# Altium schematic symbol library FPGA_Xilinx_Virtex7.SchLib: 34 symbols (part 28 of 34)
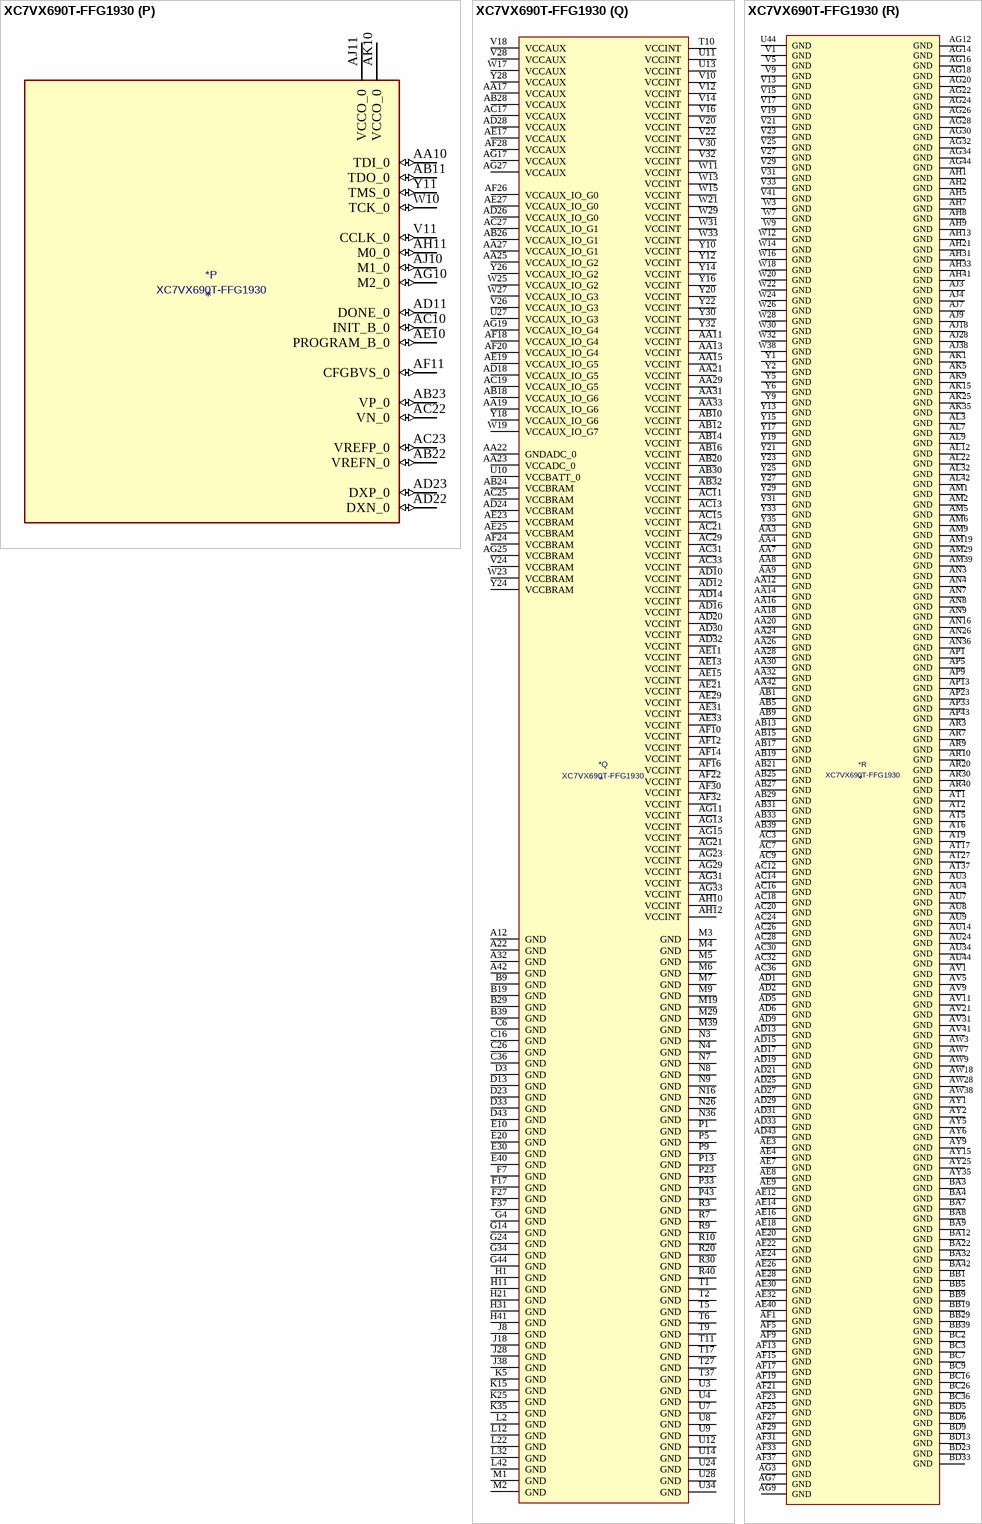
[diagram p199: symbol XC7VX690T-FFG1930]

## XC7VX690T-FFG1930
designator *  value XC7VX690T-FFG1930
ki_keywords: FPGA; ki_description: Virtex 7 XT 690 XC7VX690T-FFG1930
part A pins: AH29 IO_L4P_T0_10 (io), AH30 IO_L4N_T0_10 (io), AJ29 IO_0_VRN_10 (io), AJ30 IO_L1P_T0_10 (io), AJ31 IO_L1N_T0_10 (io), AK29 IO_L2P_T0_10 (io), AK30 VCCO_10 (power), AK31 IO_L5P_T0_10 (io), AL29 IO_L2N_T0_10 (io), AL30 IO_L3P_T0_DQS_10 (io), AL31 IO_L5N_T0_10 (io), AM30 IO_L3N_T0_DQS_10 (io), AM31 IO_25_VRP_10 (io), AN29 IO_L6P_T0_10 (io), AN30 IO_L6N_T0_VREF_10 (io), AN31 VCCO_10 (power), AP29 IO_L8P_T1_10 (io), AP30 IO_L8N_T1_10 (io), AP31 IO_L7P_T1_10 (io), AR29 IO_L10P_T1_10 (io), AR31 IO_L7N_T1_10 (io), AT29 IO_L10N_T1_10 (io), AT30 IO_L9P_T1_DQS_10 (io), AT31 IO_L9N_T1_DQS_10 (io), AU29 VCCO_10 (power), AU30 IO_L11P_T1_SRCC_10 (io), AU31 IO_L11N_T1_SRCC_10 (io), AV29 IO_L12P_T1_MRCC_10 (io), AV30 IO_L12N_T1_MRCC_10 (io), AV32 IO_L13P_T2_MRCC_10 (io), AW29 IO_L15P_T2_DQS_10 (io), AW30 IO_L14P_T2_SRCC_10 (io), AW31 IO_L14N_T2_SRCC_10 (io), AW32 IO_L13N_T2_MRCC_10 (io), AW33 VCCO_10 (power), AW34 IO_0_VRN_11 (io), AW41 IO_L7P_T1_11 (io), AW42 IO_L6P_T0_11 (io), AW43 VCCO_11 (power), AW44 IO_L1P_T0_11 (io), AY29 IO_L15N_T2_DQS_10 (io), AY30 VCCO_10 (power), AY31 IO_L16P_T2_10 (io), AY32 IO_L16N_T2_10 (io), AY33 IO_L24P_T3_11 (io), AY34 IO_25_VRP_11 (io), AY36 IO_L18P_T2_11 (io), AY37 IO_L16P_T2_11 (io), AY38 IO_L16N_T2_11 (io), AY39 IO_L11P_T1_SRCC_11 (io), AY40 VCCO_11 (power), AY41 IO_L7N_T1_11 (io), AY42 IO_L6N_T0_VREF_11 (io), AY43 IO_L3P_T0_DQS_11 (io), AY44 IO_L1N_T0_11 (io), BA28 IO_L17P_T2_10 (io), BA29 IO_L17N_T2_10 (io), BA30 IO_L18P_T2_10 (io), BA31 IO_L18N_T2_10 (io), BA33 IO_L24N_T3_11 (io), BA34 IO_L19P_T3_11 (io), BA35 IO_L19N_T3_VREF_11 (io), BA36 IO_L18N_T2_11 (io), BA37 VCCO_11 (power), BA38 IO_L13P_T2_MRCC_11 (io), BA39 IO_L11N_T1_SRCC_11 (io), BA40 IO_L9P_T1_DQS_11 (io), BA41 IO_L9N_T1_DQS_11 (io), BA43 IO_L5P_T0_11 (io), BA44 IO_L3N_T0_DQS_11 (io), BB28 IO_L24P_T3_10 (io), BB30 IO_L22P_T3_10 (io), BB31 IO_L19P_T3_10 (io), BB32 IO_L19N_T3_VREF_10 (io), BB33 IO_L22P_T3_11 (io), BB34 VCCO_11 (power), BB35 IO_L23P_T3_11 (io), BB36 IO_L15P_T2_DQS_11 (io), BB37 IO_L15N_T2_DQS_11 (io), BB38 IO_L13N_T2_MRCC_11 (io), BB40 IO_L8P_T1_11 (io), BB41 IO_L8N_T1_11 (io), BB42 IO_L4P_T0_11 (io), BB43 IO_L5N_T0_11 (io), BB44 VCCO_11 (power), BC28 IO_L24N_T3_10 (io), BC29 IO_L23P_T3_10 (io), BC30 IO_L22N_T3_10 (io), BC31 VCCO_10 (power), BC32 IO_L20P_T3_10 (io), BC33 IO_L22N_T3_11 (io), BC34 IO_L20P_T3_11 (io), BC35 IO_L23N_T3_11 (io), BC37 IO_L17P_T2_11 (io), BC38 IO_L14P_T2_SRCC_11 (io), BC39 IO_L12P_T1_MRCC_11 (io), BC40 IO_L10P_T1_11 (io), BC41 VCCO_11 (power), BC42 IO_L2P_T0_11 (io), BC43 IO_L4N_T0_11 (io), BD29 IO_L23N_T3_10 (io), BD30 IO_L21P_T3_DQS_10 (io), BD31 IO_L21N_T3_DQS_10 (io), BD32 IO_L20N_T3_10 (io), BD34 IO_L20N_T3_11 (io), BD35 IO_L21P_T3_DQS_11 (io), BD36 IO_L21N_T3_DQS_11 (io), BD37 IO_L17N_T2_11 (io), BD38 VCCO_11 (power), BD39 IO_L14N_T2_SRCC_11 (io), BD40 IO_L12N_T1_MRCC_11 (io), BD41 IO_L10N_T1_11 (io), BD42 IO_L2N_T0_11 (io)
part B pins: AH26 VCCO_12 (power), AH27 IO_L2P_T0_12 (io), AH28 IO_0_VRN_12 (io), AJ25 IO_L3P_T0_DQS_12 (io), AJ26 IO_L3N_T0_DQS_12 (io), AJ27 IO_L2N_T0_12 (io), AK26 IO_L4P_T0_12 (io), AK27 IO_L4N_T0_12 (io), AK28 IO_L1P_T0_12 (io), AL25 IO_L5P_T0_12 (io), AL26 IO_L6P_T0_12 (io), AL27 VCCO_12 (power), AL28 IO_L1N_T0_12 (io), AM25 IO_L5N_T0_12 (io), AM26 IO_L6N_T0_VREF_12 (io), AM27 IO_25_VRP_12 (io), AM28 IO_L7P_T1_12 (io), AN25 IO_L8P_T1_12 (io), AN27 IO_L9P_T1_DQS_12 (io), AN28 IO_L7N_T1_12 (io), AP25 IO_L8N_T1_12 (io), AP26 IO_L10P_T1_12 (io), AP27 IO_L9N_T1_DQS_12 (io), AP28 VCCO_12 (power), AP32 IO_L24P_T3_13 (io), AP34 IO_L21P_T3_DQS_13 (io), AP35 IO_0_VRN_13 (io), AP36 IO_L15P_T2_DQS_13 (io), AP38 VCCO_13 (power), AR25 VCCO_12 (power), AR26 IO_L10N_T1_12 (io), AR27 IO_L11P_T1_SRCC_12 (io), AR28 IO_L11N_T1_SRCC_12 (io), AR32 IO_L24N_T3_13 (io), AR33 IO_L23P_T3_13 (io), AR34 IO_L21N_T3_DQS_13 (io), AR35 VCCO_13 (power), AR36 IO_L17P_T2_13 (io), AR37 IO_L15N_T2_DQS_13 (io), AR38 IO_L12P_T1_MRCC_13 (io), AR39 IO_L7P_T1_13 (io), AR41 IO_L6P_T0_13 (io), AR42 IO_L5P_T0_13 (io), AR43 IO_L5N_T0_13 (io), AR44 IO_L1P_T0_13 (io), AT25 IO_L12P_T1_MRCC_12 (io), AT26 IO_L12N_T1_MRCC_12 (io), AT28 IO_L13P_T2_MRCC_12 (io), AT32 VCCO_13 (power), AT33 IO_L23N_T3_13 (io), AT34 IO_L19P_T3_13 (io), AT35 IO_L19N_T3_VREF_13 (io), AT36 IO_L17N_T2_13 (io), AT38 IO_L11P_T1_SRCC_13 (io), AT39 IO_L12N_T1_MRCC_13 (io), AT40 IO_L7N_T1_13 (io), AT41 IO_L6N_T0_VREF_13 (io), AT42 VCCO_13 (power), AT43 IO_L3P_T0_DQS_13 (io), AT44 IO_L1N_T0_13 (io), AU25 IO_L15P_T2_DQS_12 (io), AU26 IO_L14P_T2_SRCC_12 (io), AU27 IO_L14N_T2_SRCC_12 (io), AU28 IO_L13N_T2_MRCC_12 (io), AU32 IO_L20P_T3_13 (io), AU33 IO_L20N_T3_13 (io), AU35 IO_25_VRP_13 (io), AU36 IO_L13P_T2_MRCC_13 (io), AU37 IO_L13N_T2_MRCC_13 (io), AU38 IO_L11N_T1_SRCC_13 (io), AU39 VCCO_13 (power), AU40 IO_L9P_T1_DQS_13 (io), AU41 IO_L9N_T1_DQS_13 (io), AU42 IO_L4P_T0_13 (io), AU43 IO_L3N_T0_DQS_13 (io), AV25 IO_L15N_T2_DQS_12 (io), AV26 VCCO_12 (power), AV27 IO_L18P_T2_12 (io), AV28 IO_L18N_T2_12 (io), AV33 IO_L22P_T3_13 (io), AV34 IO_L22N_T3_13 (io), AV35 IO_L16P_T2_13 (io), AV36 VCCO_13 (power), AV37 IO_L14P_T2_SRCC_13 (io), AV38 IO_L14N_T2_SRCC_13 (io), AV39 IO_L10P_T1_13 (io), AV40 IO_L8P_T1_13 (io), AV42 IO_L4N_T0_13 (io), AV43 IO_L2P_T0_13 (io), AV44 IO_L2N_T0_13 (io), AW25 IO_L17P_T2_12 (io), AW26 IO_L16P_T2_12 (io), AW27 IO_L16N_T2_12 (io), AW35 IO_L16N_T2_13 (io), AW36 IO_L18P_T2_13 (io), AW37 IO_L18N_T2_13 (io), AW39 IO_L10N_T1_13 (io), AW40 IO_L8N_T1_13 (io), AY26 IO_L17N_T2_12 (io), AY27 IO_L19P_T3_12 (io), AY28 IO_L19N_T3_VREF_12 (io), BA25 IO_L21P_T3_DQS_12 (io), BA26 IO_L21N_T3_DQS_12 (io), BA27 VCCO_12 (power), BB25 IO_L20P_T3_12 (io), BB26 IO_L20N_T3_12 (io), BB27 IO_L22P_T3_12 (io), BC25 IO_L23P_T3_12 (io), BC27 IO_L22N_T3_12 (io), BD25 IO_L23N_T3_12 (io), BD26 IO_L24P_T3_12 (io), BD27 IO_L24N_T3_12 (io), BD28 VCCO_12 (power)
part C pins: AH22 IO_L2P_T0_D02_14 (io), AH23 IO_L2N_T0_D03_14 (io), AH24 IO_L1P_T0_D00_MOSI_14 (io), AH25 IO_L1N_T0_D01_DIN_14 (io), AH32 IO_L21P_T3_DQS_15 (io), AJ21 IO_0_VRN_14 (io), AJ22 IO_L6P_T0_FCS_B_14 (io), AJ23 VCCO_14 (power), AJ24 IO_L5P_T0_D06_14 (io), AJ32 IO_L21N_T3_DQS_A18_15 (io), AJ33 VCCO_15 (power), AJ34 IO_L19P_T3_A22_15 (io), AJ35 IO_0_VRN_15 (io), AJ36 IO_L13P_T2_MRCC_15 (io), AK21 IO_L4P_T0_D04_14 (io), AK22 IO_L6N_T0_D08_VREF_14 (io), AK23 IO_L3P_T0_DQS_PUDC_B_14 (io), AK24 IO_L5N_T0_D07_14 (io), AK32 IO_L20P_T3_A20_15 (io), AK33 IO_L20N_T3_A19_15 (io), AK34 IO_L19N_T3_A21_VREF_15 (io), AK36 IO_L16P_T2_A28_15 (io), AK37 IO_L13N_T2_MRCC_15 (io), AK38 IO_L11P_T1_SRCC_15 (io), AK39 IO_L9P_T1_DQS_AD3P_15 (io), AK40 VCCO_15 (power), AK41 IO_L6P_T0_15 (io), AL21 IO_L4N_T0_D05_14 (io), AL23 IO_L3N_T0_DQS_EMCCLK_14 (io), AL24 IO_25_VRP_14 (io), AL33 IO_L23P_T3_FOE_B_15 (io), AL34 IO_L23N_T3_FWE_B_15 (io), AL35 IO_L18P_T2_A24_15 (io), AL36 IO_L16N_T2_A27_15 (io), AL37 VCCO_15 (power), AL38 IO_L11N_T1_SRCC_15 (io), AL39 IO_L9N_T1_DQS_AD3N_15 (io), AL40 IO_L7P_T1_AD2P_15 (io), AL41 IO_L6N_T0_VREF_15 (io), AL43 IO_L1P_T0_AD0P_15 (io), AL44 IO_L1N_T0_AD0N_15 (io), AM21 IO_L8P_T1_D11_14 (io), AM22 IO_L8N_T1_D12_14 (io), AM23 IO_L7P_T1_D09_14 (io), AM24 VCCO_14 (power), AM32 IO_L22P_T3_A17_15 (io), AM33 IO_L22N_T3_A16_15 (io), AM34 VCCO_15 (power), AM35 IO_L17P_T2_A26_15 (io), AM36 IO_L18N_T2_A23_15 (io), AM37 IO_L14P_T2_SRCC_15 (io), AM38 IO_L14N_T2_SRCC_15 (io), AM40 IO_L7N_T1_AD2N_15 (io), AM41 IO_L2P_T0_AD8P_15 (io), AM42 IO_L2N_T0_AD8N_15 (io), AM43 IO_L5P_T0_AD9P_15 (io), AM44 VCCO_15 (power), AN21 VCCO_14 (power), AN22 IO_L10P_T1_D14_14 (io), AN23 IO_L7N_T1_D10_14 (io), AN24 IO_L9P_T1_DQS_14 (io), AN32 IO_25_VRP_15 (io), AN33 IO_L24P_T3_RS1_15 (io), AN34 IO_L24N_T3_RS0_15 (io), AN35 IO_L17N_T2_A25_15 (io), AN37 IO_L15P_T2_DQS_15 (io), AN38 IO_L12P_T1_MRCC_15 (io), AN39 IO_L12N_T1_MRCC_15 (io), AN40 IO_L8P_T1_AD10P_15 (io), AN41 VCCO_15 (power), AN42 IO_L4P_T0_15 (io), AN43 IO_L5N_T0_AD9N_15 (io), AN44 IO_L3P_T0_DQS_AD1P_15 (io), AP21 IO_L12P_T1_MRCC_14 (io), AP22 IO_L10N_T1_D15_14 (io), AP24 IO_L9N_T1_DQS_D13_14 (io), AP37 IO_L15N_T2_DQS_ADV_B_15 (io), AP39 IO_L10P_T1_AD11P_15 (io), AP40 IO_L10N_T1_AD11N_15 (io), AP41 IO_L8N_T1_AD10N_15 (io), AP42 IO_L4N_T0_15 (io), AP44 IO_L3N_T0_DQS_AD1N_15 (io), AR21 IO_L13P_T2_MRCC_14 (io), AR22 IO_L12N_T1_MRCC_14 (io), AR23 IO_L11P_T1_SRCC_14 (io), AR24 IO_L11N_T1_SRCC_14 (io), AT21 IO_L13N_T2_MRCC_14 (io), AT22 VCCO_14 (power), AT23 IO_L14P_T2_SRCC_14 (io), AT24 IO_L14N_T2_SRCC_14 (io), AU21 IO_L15P_T2_DQS_RDWR_B_14 (io), AU22 IO_L15N_T2_DQS_DOUT_CSO_B_14 (io), AU23 IO_L16P_T2_CSI_B_14 (io), AV22 IO_L17P_T2_A14_D30_14 (io), AV23 IO_L16N_T2_A15_D31_14 (io), AV24 IO_L18P_T2_A12_D28_14 (io), AW22 IO_L17N_T2_A13_D29_14 (io), AW23 VCCO_14 (power), AW24 IO_L18N_T2_A11_D27_14 (io), AY22 IO_L19P_T3_A10_D26_14 (io), AY23 IO_L19N_T3_A09_D25_VREF_14 (io), AY24 IO_L20P_T3_A08_D24_14 (io), BA23 IO_L22P_T3_A05_D21_14 (io), BA24 IO_L20N_T3_A07_D23_14 (io), BB22 IO_L23P_T3_A03_D19_14 (io), BB23 IO_L22N_T3_A04_D20_14 (io), BB24 VCCO_14 (power), BC22 IO_L21P_T3_DQS_14 (io), BC23 IO_L23N_T3_A02_D18_14 (io), BC24 IO_L24P_T3_A01_D17_14 (io), BD22 IO_L21N_T3_DQS_A06_D22_14 (io), BD24 IO_L24N_T3_A00_D16_14 (io)
part D pins: AA34 IO_L22P_T3_17 (io), AA35 IO_L21N_T3_DQS_17 (io), AA36 IO_L19P_T3_17 (io), AA37 VCCO_17 (power), AA38 IO_L15N_T2_DQS_17 (io), AA39 IO_L14P_T2_SRCC_17 (io), AA40 IO_L14N_T2_SRCC_17 (io), AA41 IO_L9N_T1_DQS_17 (io), AA43 IO_L1P_T0_17 (io), AA44 IO_L1N_T0_17 (io), AB34 VCCO_17 (power), AB35 IO_L21P_T3_DQS_17 (io), AB36 IO_L23P_T3_17 (io), AB37 IO_L23N_T3_17 (io), AB38 IO_L15P_T2_DQS_17 (io), AB40 IO_L12N_T1_MRCC_17 (io), AB41 IO_L9P_T1_DQS_17 (io), AB42 IO_L8N_T1_17 (io), AB43 IO_L5N_T0_17 (io), AB44 VCCO_17 (power), AC34 IO_L24P_T3_17 (io), AC35 IO_L24N_T3_17 (io), AC37 IO_25_VRP_17 (io), AC38 IO_L17P_T2_17 (io), AC39 IO_L17N_T2_17 (io), AC40 IO_L12P_T1_MRCC_17 (io), AC41 VCCO_17 (power), AC42 IO_L8P_T1_17 (io), AC43 IO_L5P_T0_17 (io), AC44 IO_L3N_T0_DQS_17 (io), AD34 IO_L20P_T3_16 (io), AD35 IO_L20N_T3_16 (io), AD36 IO_L19P_T3_16 (io), AD37 IO_0_VRN_16 (io), AD38 VCCO_16 (power), AD39 IO_L7P_T1_16 (io), AD40 IO_L7N_T1_16 (io), AD41 IO_L10P_T1_17 (io), AD42 IO_L10N_T1_17 (io), AD44 IO_L3P_T0_DQS_17 (io), AE34 IO_L21P_T3_DQS_16 (io), AE35 VCCO_16 (power), AE36 IO_L22P_T3_16 (io), AE37 IO_L19N_T3_VREF_16 (io), AE38 IO_L16P_T2_16 (io), AE39 IO_L16N_T2_16 (io), AE41 IO_L9P_T1_DQS_16 (io), AE42 IO_L9N_T1_DQS_16 (io), AE43 IO_L5P_T0_16 (io), AE44 IO_L3P_T0_DQS_16 (io), AF34 IO_L21N_T3_DQS_16 (io), AF35 IO_L23P_T3_16 (io), AF36 IO_L22N_T3_16 (io), AF38 IO_L18P_T2_16 (io), AF39 IO_L13P_T2_MRCC_16 (io), AF40 IO_L13N_T2_MRCC_16 (io), AF41 IO_L8P_T1_16 (io), AF42 VCCO_16 (power), AF43 IO_L5N_T0_16 (io), AF44 IO_L3N_T0_DQS_16 (io), AG35 IO_L24P_T3_16 (io), AG36 IO_L23N_T3_16 (io), AG37 IO_L15P_T2_DQS_16 (io), AG38 IO_L18N_T2_16 (io), AG39 VCCO_16 (power), AG40 IO_L11P_T1_SRCC_16 (io), AG41 IO_L8N_T1_16 (io), AG42 IO_L10P_T1_16 (io), AG43 IO_L2P_T0_16 (io), AH34 IO_25_VRP_16 (io), AH35 IO_L24N_T3_16 (io), AH36 VCCO_16 (power), AH37 IO_L17P_T2_16 (io), AH38 IO_L15N_T2_DQS_16 (io), AH39 IO_L14P_T2_SRCC_16 (io), AH40 IO_L11N_T1_SRCC_16 (io), AH42 IO_L10N_T1_16 (io), AH43 IO_L2N_T0_16 (io), AH44 IO_L1P_T0_16 (io), AJ37 IO_L17N_T2_16 (io), AJ39 IO_L14N_T2_SRCC_16 (io), AJ40 IO_L12P_T1_MRCC_16 (io), AJ41 IO_L12N_T1_MRCC_16 (io), AJ42 IO_L6P_T0_16 (io), AJ43 VCCO_16 (power), AJ44 IO_L1N_T0_16 (io), AK42 IO_L6N_T0_VREF_16 (io), AK43 IO_L4P_T0_16 (io), AK44 IO_L4N_T0_16 (io), V42 IO_L7N_T1_17 (io), V43 IO_L2P_T0_17 (io), V44 IO_L2N_T0_17 (io), W34 IO_L20P_T3_17 (io), W35 IO_L20N_T3_17 (io), W36 IO_0_VRN_17 (io), W37 IO_L16N_T2_17 (io), W39 IO_L18N_T2_17 (io), W40 IO_L13N_T2_MRCC_17 (io), W41 IO_L11N_T1_SRCC_17 (io), W42 IO_L7P_T1_17 (io), W43 VCCO_17 (power), W44 IO_L4N_T0_17 (io), Y34 IO_L22N_T3_17 (io), Y36 IO_L19N_T3_VREF_17 (io), Y37 IO_L16P_T2_17 (io), Y38 IO_L18P_T2_17 (io), Y39 IO_L13P_T2_MRCC_17 (io), Y40 VCCO_17 (power), Y41 IO_L11P_T1_SRCC_17 (io), Y42 IO_L6P_T0_17 (io), Y43 IO_L6N_T0_VREF_17 (io), Y44 IO_L4P_T0_17 (io)
part E pins: K33 IO_L4N_T0_19 (io), K34 IO_L8N_T1_19 (io), K36 IO_L12N_T1_MRCC_19 (io), K37 IO_L13P_T2_MRCC_19 (io), K38 IO_L13N_T2_MRCC_19 (io), K39 IO_L16N_T2_19 (io), K40 VCCO_19 (power), K41 IO_L19N_T3_VREF_19 (io), K42 IO_L21P_T3_DQS_19 (io), K43 IO_L21N_T3_DQS_19 (io), K44 IO_L24N_T3_19 (io), L30 IO_0_VRN_19 (io), L31 IO_L2N_T0_19 (io), L33 IO_L4P_T0_19 (io), L34 IO_L8P_T1_19 (io), L35 IO_L10N_T1_19 (io), L36 IO_L12P_T1_MRCC_19 (io), L37 VCCO_19 (power), L38 IO_L14N_T2_SRCC_19 (io), L39 IO_L16P_T2_19 (io), L40 IO_L18N_T2_19 (io), L41 IO_L19P_T3_19 (io), L43 IO_L23N_T3_19 (io), L44 IO_L24P_T3_19 (io), M30 IO_L2P_T0_19 (io), M31 IO_L1P_T0_19 (io), M32 IO_L1N_T0_19 (io), M33 IO_L6N_T0_VREF_19 (io), M34 VCCO_19 (power), M35 IO_L10P_T1_19 (io), M36 IO_L9N_T1_DQS_19 (io), M37 IO_L11N_T1_SRCC_19 (io), M38 IO_L14P_T2_SRCC_19 (io), M40 IO_L18P_T2_19 (io), M41 IO_L17N_T2_19 (io), M42 IO_L20N_T3_19 (io), M43 IO_L23P_T3_19 (io), M44 VCCO_19 (power), N30 IO_L3N_T0_DQS_19 (io), N31 VCCO_19 (power), N32 IO_L6P_T0_19 (io), N33 IO_25_VRP_19 (io), N34 IO_L7N_T1_19 (io), N35 IO_L9P_T1_DQS_19 (io), N37 IO_L11P_T1_SRCC_19 (io), N38 IO_L15P_T2_DQS_19 (io), N39 IO_L15N_T2_DQS_19 (io), N40 IO_L17P_T2_19 (io), N41 VCCO_19 (power), N42 IO_L20P_T3_19 (io), N43 IO_L22P_T3_19 (io), N44 IO_L22N_T3_19 (io), P30 IO_L3P_T0_DQS_19 (io), P31 IO_L5P_T0_19 (io), P32 IO_L5N_T0_19 (io), P34 IO_L7P_T1_19 (io), P35 IO_0_VRN_18 (io), P36 IO_L8N_T1_18 (io), P37 IO_L12N_T1_MRCC_18 (io), P38 VCCO_18 (power), P39 IO_L15P_T2_DQS_18 (io), P40 IO_L15N_T2_DQS_18 (io), P41 IO_L21P_T3_DQS_18 (io), P42 IO_L21N_T3_DQS_18 (io), P44 IO_L24N_T3_18 (io), R31 IO_L2P_T0_18 (io), R32 IO_L2N_T0_18 (io), R33 IO_L4P_T0_18 (io), R34 IO_L4N_T0_18 (io), R35 VCCO_18 (power), R36 IO_L8P_T1_18 (io), R37 IO_L12P_T1_MRCC_18 (io), R38 IO_L14P_T2_SRCC_18 (io), R39 IO_L14N_T2_SRCC_18 (io), R41 IO_L19N_T3_VREF_18 (io), R42 IO_L23P_T3_18 (io), R43 IO_L23N_T3_18 (io), R44 IO_L24P_T3_18 (io), T30 IO_L1P_T0_18 (io), T31 IO_L1N_T0_18 (io), T32 VCCO_18 (power), T33 IO_L6P_T0_18 (io), T34 IO_L6N_T0_VREF_18 (io), T35 IO_L10P_T1_18 (io), T36 IO_L10N_T1_18 (io), T38 IO_L13N_T2_MRCC_18 (io), T39 IO_L17P_T2_18 (io), T40 IO_L17N_T2_18 (io), T41 IO_L19P_T3_18 (io), T42 VCCO_18 (power), T43 IO_L22P_T3_18 (io), T44 IO_L22N_T3_18 (io), U30 IO_L3P_T0_DQS_18 (io), U31 IO_L3N_T0_DQS_18 (io), U32 IO_L5P_T0_18 (io), U33 IO_L5N_T0_18 (io), U35 IO_L9N_T1_DQS_18 (io), U36 IO_L7P_T1_18 (io), U37 IO_L7N_T1_18 (io), U38 IO_L13P_T2_MRCC_18 (io), U39 VCCO_18 (power), U40 IO_L18P_T2_18 (io), U41 IO_L18N_T2_18 (io), U42 IO_L20P_T3_18 (io), U43 IO_L20N_T3_18 (io), V34 IO_25_VRP_18 (io), V35 IO_L9P_T1_DQS_18 (io), V36 VCCO_18 (power), V37 IO_L11P_T1_SRCC_18 (io), V38 IO_L11N_T1_SRCC_18 (io), V39 IO_L16P_T2_18 (io), V40 IO_L16N_T2_18 (io)
part F pins: A37 VCCO_21 (power), B34 VCCO_21 (power), C31 VCCO_21 (power), C41 VCCO_21 (power), D38 VCCO_21 (power), E35 VCCO_20 (power), F32 VCCO_20 (power), F42 VCCO_21 (power), G39 VCCO_20 (power), H36 VCCO_20 (power), J33 VCCO_20 (power), J43 VCCO_20 (power)
part G pins: AH14 IO_0_VRN_31 (io), AH15 IO_L4P_T0_31 (io), AH16 VCCO_31 (power), AH17 IO_25_VRP_30 (io), AH18 IO_0_VRN_30 (io), AH19 IO_L3P_T0_DQS_30 (io), AH20 IO_L5P_T0_30 (io), AJ14 IO_L1P_T0_31 (io), AJ15 IO_L4N_T0_31 (io), AJ16 IO_L2P_T0_31 (io), AJ17 IO_L1P_T0_30 (io), AJ19 IO_L3N_T0_DQS_30 (io), AJ20 IO_L5N_T0_30 (io), AK14 IO_L1N_T0_31 (io), AK16 IO_L2N_T0_31 (io), AK17 IO_L1N_T0_30 (io), AK18 IO_L2P_T0_30 (io), AK19 IO_L4P_T0_30 (io), AK20 VCCO_30 (power), AL14 IO_L3N_T0_DQS_31 (io), AL15 IO_L3P_T0_DQS_31 (io), AL16 IO_L5P_T0_31 (io), AL17 VCCO_30 (power), AL18 IO_L2N_T0_30 (io), AL19 IO_L4N_T0_30 (io), AL20 IO_L6P_T0_30 (io), AM14 VCCO_31 (power), AM15 IO_L6P_T0_31 (io), AM16 IO_L5N_T0_31 (io), AM17 IO_25_VRP_31 (io), AM18 IO_L7P_T1_30 (io), AM20 IO_L6N_T0_VREF_30 (io), AN15 IO_L6N_T0_VREF_31 (io), AN17 IO_L7N_T1_30 (io), AN18 IO_L8N_T1_30 (io), AN19 IO_L8P_T1_30 (io), AN20 IO_L10P_T1_30 (io), AP14 IO_L8N_T1_31 (io), AP15 IO_L8P_T1_31 (io), AP16 IO_L10P_T1_31 (io), AP17 IO_L7P_T1_31 (io), AP18 VCCO_30 (power), AP19 IO_L9P_T1_DQS_30 (io), AP20 IO_L10N_T1_30 (io), AR14 IO_L9P_T1_DQS_31 (io), AR15 VCCO_31 (power), AR16 IO_L10N_T1_31 (io), AR17 IO_L7N_T1_31 (io), AR18 IO_L9N_T1_DQS_30 (io), AR19 IO_L12P_T1_MRCC_30 (io), AT14 IO_L9N_T1_DQS_31 (io), AT15 IO_L11P_T1_SRCC_31 (io), AT16 IO_L12P_T1_MRCC_31 (io), AT18 IO_L12N_T1_MRCC_30 (io), AT19 IO_L11N_T1_SRCC_30 (io), AT20 IO_L11P_T1_SRCC_30 (io), AU15 IO_L11N_T1_SRCC_31 (io), AU16 IO_L12N_T1_MRCC_31 (io), AU17 IO_L14P_T2_SRCC_31 (io), AU18 IO_L14P_T2_SRCC_30 (io), AU19 VCCO_30 (power), AU20 IO_L13P_T2_MRCC_30 (io), AV14 IO_L13N_T2_MRCC_31 (io), AV15 IO_L13P_T2_MRCC_31 (io), AV16 VCCO_31 (power), AV17 IO_L14N_T2_SRCC_31 (io), AV18 IO_L14N_T2_SRCC_30 (io), AV19 IO_L15P_T2_DQS_30 (io), AV20 IO_L13N_T2_MRCC_30 (io), AW14 IO_L15P_T2_DQS_31 (io), AW15 IO_L17N_T2_31 (io), AW16 IO_L17P_T2_31 (io), AW17 IO_L18P_T2_31 (io), AW19 IO_L15N_T2_DQS_30 (io), AW20 IO_L18P_T2_30 (io), AW21 IO_L16P_T2_30 (io), AY14 IO_L15N_T2_DQS_31 (io), AY16 IO_L16P_T2_31 (io), AY17 IO_L18N_T2_31 (io), AY18 IO_L17P_T2_30 (io), AY19 IO_L18N_T2_30 (io), AY20 VCCO_30 (power), AY21 IO_L16N_T2_30 (io), BA14 IO_L19N_T3_VREF_31 (io), BA15 IO_L19P_T3_31 (io), BA16 IO_L16N_T2_31 (io), BA17 VCCO_31 (power), BA18 IO_L17N_T2_30 (io), BA19 IO_L19N_T3_VREF_30 (io), BA20 IO_L19P_T3_30 (io), BA21 IO_L20P_T3_30 (io), BB14 VCCO_31 (power), BB15 IO_L20N_T3_31 (io), BB16 IO_L20P_T3_31 (io), BB17 IO_L23P_T3_31 (io), BB18 IO_L23P_T3_30 (io), BB20 IO_L22P_T3_30 (io), BB21 IO_L20N_T3_30 (io), BC14 IO_L22N_T3_31 (io), BC15 IO_L22P_T3_31 (io), BC17 IO_L23N_T3_31 (io), BC18 IO_L23N_T3_30 (io), BC19 IO_L21P_T3_DQS_30 (io), BC20 IO_L22N_T3_30 (io), BC21 VCCO_30 (power), BD14 IO_L21N_T3_DQS_31 (io), BD15 IO_L21P_T3_DQS_31 (io), BD16 IO_L24N_T3_31 (io), BD17 IO_L24P_T3_31 (io), BD18 VCCO_30 (power), BD19 IO_L21N_T3_DQS_30 (io), BD20 IO_L24N_T3_30 (io), BD21 IO_L24P_T3_30 (io)
part H pins: A27 VCCO_33 (power), A28 IO_L20P_T3_33 (io), A29 IO_L20N_T3_33 (io), A30 IO_L24N_T3_33 (io), AJ12 IO_L1P_T0_32 (io), AJ13 VCCO_32 (power), AK11 IO_0_VRN_32 (io), AK12 IO_L1N_T0_32 (io), AK13 IO_L2P_T0_32 (io), AL10 IO_L4N_T0_32 (io), AL11 IO_L4P_T0_32 (io), AL13 IO_L2N_T0_32 (io), AM10 IO_L6N_T0_VREF_32 (io), AM11 IO_L6P_T0_32 (io), AM12 IO_L3P_T0_DQS_32 (io), AM13 IO_L5P_T0_32 (io), AN10 IO_L8P_T1_32 (io), AN11 VCCO_32 (power), AN12 IO_L3N_T0_DQS_32 (io), AN13 IO_L5N_T0_32 (io), AN14 IO_25_VRP_32 (io), AP10 IO_L8N_T1_32 (io), AP11 IO_L10P_T1_32 (io), AP12 IO_L7P_T1_32 (io), AR11 IO_L10N_T1_32 (io), AR12 IO_L7N_T1_32 (io), AR13 IO_L9P_T1_DQS_32 (io), AT10 IO_L12N_T1_MRCC_32 (io), AT11 IO_L12P_T1_MRCC_32 (io), AT12 VCCO_32 (power), AT13 IO_L9N_T1_DQS_32 (io), AU10 IO_L13N_T2_MRCC_32 (io), AU11 IO_L13P_T2_MRCC_32 (io), AU12 IO_L11N_T1_SRCC_32 (io), AU13 IO_L11P_T1_SRCC_32 (io), AV10 IO_L15P_T2_DQS_32 (io), AV12 IO_L14N_T2_SRCC_32 (io), AV13 IO_L14P_T2_SRCC_32 (io), AW10 IO_L15N_T2_DQS_32 (io), AW11 IO_L17P_T2_32 (io), AW12 IO_L16P_T2_32 (io), AW13 VCCO_32 (power), AY10 VCCO_32 (power), AY11 IO_L17N_T2_32 (io), AY12 IO_L16N_T2_32 (io), AY13 IO_L18P_T2_32 (io), B27 IO_L23P_T3_33 (io), B28 IO_L23N_T3_33 (io), B30 IO_L24P_T3_33 (io), BA10 IO_L19N_T3_VREF_32 (io), BA11 IO_L19P_T3_32 (io), BA13 IO_L18N_T2_32 (io), BB10 IO_L21N_T3_DQS_32 (io), BB11 IO_L21P_T3_DQS_32 (io), BB12 IO_L20N_T3_32 (io), BB13 IO_L20P_T3_32 (io), BC10 IO_L23P_T3_32 (io), BC11 VCCO_32 (power), BC12 IO_L22N_T3_32 (io), BC13 IO_L22P_T3_32 (io), BD10 IO_L23N_T3_32 (io), BD11 IO_L24N_T3_32 (io), BD12 IO_L24P_T3_32 (io), C27 IO_L21P_T3_DQS_33 (io), C28 IO_L21N_T3_DQS_33 (io), C29 IO_L22P_T3_33 (io), C30 IO_L22N_T3_33 (io), D27 IO_L15N_T2_DQS_33 (io), D28 VCCO_33 (power), D29 IO_L19P_T3_33 (io), D30 IO_L19N_T3_VREF_33 (io), E27 IO_L15P_T2_DQS_33 (io), E28 IO_L17N_T2_33 (io), E29 IO_L16N_T2_33 (io), F28 IO_L17P_T2_33 (io), F29 IO_L16P_T2_33 (io), F30 IO_L18N_T2_33 (io), G27 IO_L14P_T2_SRCC_33 (io), G28 IO_L14N_T2_SRCC_33 (io), G29 VCCO_33 (power), G30 IO_L18P_T2_33 (io), H27 IO_L13P_T2_MRCC_33 (io), H28 IO_L13N_T2_MRCC_33 (io), H29 IO_L12P_T1_MRCC_33 (io), H30 IO_L12N_T1_MRCC_33 (io), J27 IO_L10N_T1_33 (io), J29 IO_L11P_T1_SRCC_33 (io), J30 IO_L11N_T1_SRCC_33 (io), K27 IO_L10P_T1_33 (io), K28 IO_L8N_T1_33 (io), K29 IO_L9N_T1_DQS_33 (io), K30 VCCO_33 (power), L27 VCCO_33 (power), L28 IO_L8P_T1_33 (io), L29 IO_L9P_T1_DQS_33 (io), M27 IO_L7P_T1_33 (io), M28 IO_L7N_T1_33 (io), N27 IO_L5P_T0_33 (io), N28 IO_L5N_T0_33 (io), N29 IO_25_VRP_33 (io), P26 IO_L4P_T0_33 (io), P27 IO_L4N_T0_33 (io), P28 VCCO_33 (power), P29 IO_L3N_T0_DQS_33 (io), R26 IO_L2N_T0_33 (io), R27 IO_L6P_T0_33 (io), R28 IO_L6N_T0_VREF_33 (io), R29 IO_L3P_T0_DQS_33 (io), T26 IO_L2P_T0_33 (io), T28 IO_L1P_T0_33 (io), T29 IO_L1N_T0_33 (io), U26 IO_0_VRN_33 (io), U29 VCCO_33 (power)
part I pins: A20 IO_L24N_T3_35 (io), A21 IO_L24P_T3_35 (io), A23 IO_L23N_T3_35 (io), A24 IO_L21P_T3_DQS_34 (io), A25 IO_L21N_T3_DQS_34 (io), A26 IO_L23N_T3_34 (io), B20 IO_L20N_T3_35 (io), B21 IO_L22N_T3_35 (io), B22 IO_L21N_T3_DQS_35 (io), B23 IO_L23P_T3_35 (io), B24 VCCO_34 (power), B25 IO_L24N_T3_34 (io), B26 IO_L23P_T3_34 (io), C20 IO_L20P_T3_35 (io), C21 VCCO_35 (power), C22 IO_L22P_T3_35 (io), C23 IO_L21P_T3_DQS_35 (io), C24 IO_L24P_T3_34 (io), C25 IO_L22N_T3_34 (io), D20 IO_L19N_T3_VREF_35 (io), D21 IO_L19P_T3_35 (io), D22 IO_L18N_T2_35 (io), D24 IO_L20N_T3_34 (io), D25 IO_L22P_T3_34 (io), D26 IO_L19N_T3_VREF_34 (io), E21 IO_L16N_T2_35 (io), E22 IO_L16P_T2_35 (io), E23 IO_L18P_T2_35 (io), E24 IO_L20P_T3_34 (io), E25 VCCO_34 (power), E26 IO_L19P_T3_34 (io), F20 IO_L15N_T2_DQS_35 (io), F21 IO_L17N_T2_35 (io), F22 VCCO_35 (power), F23 IO_L17N_T2_34 (io), F24 IO_L16P_T2_34 (io), F25 IO_L16N_T2_34 (io), F26 IO_L18N_T2_34 (io), G20 IO_L15P_T2_DQS_35 (io), G21 IO_L17P_T2_35 (io), G22 IO_L14N_T2_SRCC_35 (io), G23 IO_L17P_T2_34 (io), G25 IO_L15N_T2_DQS_34 (io), G26 IO_L18P_T2_34 (io), H20 IO_L13N_T2_MRCC_35 (io), H22 IO_L14P_T2_SRCC_35 (io), H23 IO_L13P_T2_MRCC_34 (io), H24 IO_L13N_T2_MRCC_34 (io), H25 IO_L15P_T2_DQS_34 (io), H26 VCCO_34 (power), J20 IO_L13P_T2_MRCC_35 (io), J21 IO_L12N_T1_MRCC_35 (io), J22 IO_L11N_T1_SRCC_35 (io), J23 VCCO_34 (power), J24 IO_L12N_T1_MRCC_34 (io), J25 IO_L14P_T2_SRCC_34 (io), J26 IO_L14N_T2_SRCC_34 (io), K20 VCCO_35 (power), K21 IO_L12P_T1_MRCC_35 (io), K22 IO_L11P_T1_SRCC_35 (io), K23 IO_L10N_T1_34 (io), K24 IO_L12P_T1_MRCC_34 (io), K26 IO_L11N_T1_SRCC_34 (io), L19 IO_L9N_T1_DQS_AD7N_35 (io), L20 IO_L9P_T1_DQS_AD7P_35 (io), L21 IO_L10N_T1_AD15N_35 (io), L23 IO_L10P_T1_34 (io), L24 IO_L7P_T1_34 (io), L25 IO_L7N_T1_34 (io), L26 IO_L11P_T1_SRCC_34 (io), M20 IO_L8N_T1_AD14N_35 (io), M21 IO_L10P_T1_AD15P_35 (io), M22 IO_L7N_T1_AD6N_35 (io), M23 IO_L8N_T1_34 (io), M24 VCCO_34 (power), M25 IO_L9P_T1_DQS_34 (io), M26 IO_L9N_T1_DQS_34 (io), N19 IO_L6N_T0_VREF_35 (io), N20 IO_L8P_T1_AD14P_35 (io), N21 VCCO_35 (power), N22 IO_L7P_T1_AD6P_35 (io), N23 IO_L8P_T1_34 (io), N24 IO_L1N_T0_34 (io), N25 IO_25_VRP_34 (io), P18 VCCO_35 (power), P19 IO_L4N_T0_35 (io), P20 IO_L6P_T0_35 (io), P21 IO_25_VRP_35 (io), P22 IO_L4N_T0_34 (io), P24 IO_L1P_T0_34 (io), P25 IO_L3N_T0_DQS_34 (io), R18 IO_L2N_T0_AD12N_35 (io), R19 IO_L4P_T0_35 (io), R21 IO_L5N_T0_AD13N_35 (io), R22 IO_L4P_T0_34 (io), R23 IO_L2N_T0_34 (io), R24 IO_L3P_T0_DQS_34 (io), R25 VCCO_34 (power), T18 IO_L2P_T0_AD12P_35 (io), T19 IO_L1N_T0_AD4N_35 (io), T20 IO_L1P_T0_AD4P_35 (io), T21 IO_L5P_T0_AD13P_35 (io), T22 VCCO_34 (power), T23 IO_L2P_T0_34 (io), T24 IO_L6N_T0_VREF_34 (io), T25 IO_L5N_T0_34 (io), U18 IO_0_VRN_35 (io), U19 VCCO_35 (power), U20 IO_L3N_T0_DQS_AD5N_35 (io), U21 IO_L3P_T0_DQS_AD5P_35 (io), U22 IO_0_VRN_34 (io), U23 IO_L6P_T0_34 (io), U25 IO_L5P_T0_34 (io)
part J pins: A3 IO_L1N_T0_36 (io), A4 IO_L1P_T0_36 (io), A5 IO_L4N_T0_36 (io), A6 IO_L2N_T0_36 (io), A7 VCCO_37 (power), A8 IO_L2N_T0_37 (io), A9 IO_L2P_T0_37 (io), A10 IO_L3N_T0_DQS_37 (io), A11 IO_L1N_T0_37 (io), B2 IO_L5N_T0_36 (io), B3 IO_L3N_T0_DQS_36 (io), B4 VCCO_36 (power), B5 IO_L4P_T0_36 (io), B6 IO_L2P_T0_36 (io), B7 IO_L4N_T0_37 (io), B8 IO_L4P_T0_37 (io), B10 IO_L3P_T0_DQS_37 (io), B11 IO_L1P_T0_37 (io), C1 VCCO_36 (power), C2 IO_L5P_T0_36 (io), C3 IO_L3P_T0_DQS_36 (io), C4 IO_L6N_T0_VREF_36 (io), C5 IO_L6P_T0_36 (io), C7 IO_L6N_T0_VREF_37 (io), C8 IO_L6P_T0_37 (io), C9 IO_L5N_T0_37 (io), C10 IO_L5P_T0_37 (io), C11 VCCO_37 (power), D1 IO_L7N_T1_36 (io), D2 IO_L7P_T1_36 (io), D4 IO_L10N_T1_36 (io), D5 IO_L8N_T1_36 (io), D6 IO_L10N_T1_37 (io), D7 IO_L10P_T1_37 (io), D8 VCCO_37 (power), D9 IO_L9N_T1_DQS_37 (io), D10 IO_L9P_T1_DQS_37 (io), D11 IO_L7N_T1_37 (io), E1 IO_L9N_T1_DQS_36 (io), E2 IO_L12N_T1_MRCC_36 (io), E3 IO_L12P_T1_MRCC_36 (io), E4 IO_L10P_T1_36 (io), E5 VCCO_36 (power), E6 IO_L8P_T1_36 (io), E7 IO_L12N_T1_MRCC_37 (io), E8 IO_L8N_T1_37 (io), E9 IO_L8P_T1_37 (io), E11 IO_L7P_T1_37 (io), F1 IO_L9P_T1_DQS_36 (io), F2 VCCO_36 (power), F3 IO_L11N_T1_SRCC_36 (io), F4 IO_L11P_T1_SRCC_36 (io), F5 IO_L13N_T2_MRCC_36 (io), F6 IO_L13P_T2_MRCC_36 (io), F8 IO_L12P_T1_MRCC_37 (io), F9 IO_L11N_T1_SRCC_37 (io), F10 IO_L11P_T1_SRCC_37 (io), F11 IO_L13N_T2_MRCC_37 (io), G1 IO_L18N_T2_36 (io), G2 IO_L14N_T2_SRCC_36 (io), G3 IO_L14P_T2_SRCC_36 (io), G5 IO_L15N_T2_DQS_36 (io), G6 IO_L15P_T2_DQS_36 (io), G7 IO_L14N_T2_SRCC_37 (io), G8 IO_L14P_T2_SRCC_37 (io), G9 VCCO_37 (power), G10 IO_L16N_T2_37 (io), G11 IO_L13P_T2_MRCC_37 (io), H2 IO_L18P_T2_36 (io), H3 IO_L16N_T2_36 (io), H4 IO_L16P_T2_36 (io), H5 IO_L17N_T2_36 (io), H6 VCCO_36 (power), H7 IO_L17N_T2_37 (io), H8 IO_L17P_T2_37 (io), H9 IO_L15N_T2_DQS_37 (io), H10 IO_L16P_T2_37 (io), J1 IO_L20N_T3_36 (io), J2 IO_L20P_T3_36 (io), J3 VCCO_36 (power), J4 IO_L19N_T3_VREF_36 (io), J5 IO_L19P_T3_36 (io), J6 IO_L17P_T2_36 (io), J7 IO_L20N_T3_37 (io), J9 IO_L15P_T2_DQS_37 (io), J10 IO_L18N_T2_37 (io), J11 IO_L18P_T2_37 (io), K1 IO_L22N_T3_36 (io), K2 IO_L23N_T3_36 (io), K3 IO_L21N_T3_DQS_36 (io), K4 IO_L21P_T3_DQS_36 (io), K6 IO_0_VRN_36 (io), K7 IO_L20P_T3_37 (io), K8 IO_L19N_T3_VREF_37 (io), K9 IO_L19P_T3_37 (io), K10 VCCO_37 (power), K11 IO_0_VRN_37 (io), L1 IO_L22P_T3_36 (io), L3 IO_L23P_T3_36 (io), L4 IO_25_VRP_36 (io), L5 IO_L24N_T3_36 (io), L6 IO_L24P_T3_36 (io), L7 VCCO_37 (power), L8 IO_L22N_T3_37 (io), L9 IO_L22P_T3_37 (io), L10 IO_L21N_T3_DQS_37 (io), L11 IO_L21P_T3_DQS_37 (io), M8 IO_25_VRP_37 (io), M10 IO_L23N_T3_37 (io), M11 IO_L23P_T3_37 (io), N10 IO_L24N_T3_37 (io), N11 VCCO_37 (power), P10 IO_L24P_T3_37 (io)
part K pins: A13 IO_L3N_T0_DQS_38 (io), A14 IO_L3P_T0_DQS_38 (io), A15 IO_L24N_T3_39 (io), A16 IO_L24P_T3_39 (io), A17 VCCO_39 (power), A18 IO_L23N_T3_39 (io), A19 IO_L23P_T3_39 (io), B12 IO_L2N_T0_38 (io), B13 IO_L5N_T0_38 (io), B14 VCCO_38 (power), B15 IO_L20N_T3_39 (io), B16 IO_L22N_T3_39 (io), B17 IO_L21N_T3_DQS_39 (io), B18 IO_L21P_T3_DQS_39 (io), C12 IO_L2P_T0_38 (io), C13 IO_L5P_T0_38 (io), C14 IO_L1N_T0_38 (io), C15 IO_L20P_T3_39 (io), C17 IO_L22P_T3_39 (io), C18 IO_L19N_T3_VREF_39 (io), C19 IO_L19P_T3_39 (io), D12 IO_L4N_T0_38 (io), D14 IO_L1P_T0_38 (io), D15 IO_L18N_T2_39 (io), D16 IO_L18P_T2_39 (io), D17 IO_L16N_T2_39 (io), D18 VCCO_39 (power), D19 IO_L17N_T2_39 (io), E12 IO_L4P_T0_38 (io), E13 IO_L6N_T0_VREF_38 (io), E14 IO_L6P_T0_38 (io), E15 VCCO_38 (power), E16 IO_L13N_T2_MRCC_39 (io), E17 IO_L16P_T2_39 (io), E18 IO_L15N_T2_DQS_39 (io), E19 IO_L17P_T2_39 (io), F12 VCCO_38 (power), F13 IO_L9N_T1_DQS_38 (io), F14 IO_L9P_T1_DQS_38 (io), F15 IO_L7N_T1_38 (io), F16 IO_L13P_T2_MRCC_39 (io), F18 IO_L14N_T2_SRCC_39 (io), F19 IO_L15P_T2_DQS_39 (io), G12 IO_L8N_T1_38 (io), G13 IO_L8P_T1_38 (io), G15 IO_L7P_T1_38 (io), G16 IO_L12N_T1_MRCC_39 (io), G17 IO_L12P_T1_MRCC_39 (io), G18 IO_L14P_T2_SRCC_39 (io), G19 VCCO_39 (power), H12 IO_L11N_T1_SRCC_38 (io), H13 IO_L11P_T1_SRCC_38 (io), H14 IO_L10N_T1_38 (io), H15 IO_L10P_T1_38 (io), H16 VCCO_39 (power), H17 IO_L11N_T1_SRCC_39 (io), H18 IO_L11P_T1_SRCC_39 (io), H19 IO_L10N_T1_39 (io), J12 IO_L14N_T2_SRCC_38 (io), J13 VCCO_38 (power), J14 IO_L12N_T1_MRCC_38 (io), J15 IO_L12P_T1_MRCC_38 (io), J16 IO_L7N_T1_39 (io), J17 IO_L7P_T1_39 (io), J19 IO_L10P_T1_39 (io), K12 IO_L14P_T2_SRCC_38 (io), K13 IO_L13N_T2_MRCC_38 (io), K14 IO_L13P_T2_MRCC_38 (io), K16 IO_L8N_T1_39 (io), K17 IO_L8P_T1_39 (io), K18 IO_L9N_T1_DQS_39 (io), K19 IO_L9P_T1_DQS_39 (io), L13 IO_L16N_T2_38 (io), L14 IO_L16P_T2_38 (io), L15 IO_L15N_T2_DQS_38 (io), L16 IO_L2N_T0_39 (io), L17 VCCO_39 (power), L18 IO_0_VRN_39 (io), M12 IO_L18N_T2_38 (io), M13 IO_L18P_T2_38 (io), M14 VCCO_38 (power), M15 IO_L15P_T2_DQS_38 (io), M16 IO_L2P_T0_39 (io), M17 IO_L1N_T0_39 (io), M18 IO_L1P_T0_39 (io), N12 IO_L19N_T3_VREF_38 (io), N13 IO_L19P_T3_38 (io), N14 IO_L17N_T2_38 (io), N15 IO_L17P_T2_38 (io), N17 IO_L3N_T0_DQS_39 (io), N18 IO_L3P_T0_DQS_39 (io), P11 IO_L20N_T3_38 (io), P12 IO_L20P_T3_38 (io), P14 IO_L21N_T3_DQS_38 (io), P15 IO_0_VRN_38 (io), P16 IO_L5N_T0_39 (io), P17 IO_L6N_T0_VREF_39 (io), R11 IO_25_VRP_38 (io), R12 IO_L22N_T3_38 (io), R13 IO_L22P_T3_38 (io), R14 IO_L21P_T3_DQS_38 (io), R15 VCCO_39 (power), R16 IO_L5P_T0_39 (io), R17 IO_L6P_T0_39 (io), T12 VCCO_38 (power), T13 IO_L23N_T3_38 (io), T14 IO_L23P_T3_38 (io), T15 IO_L24N_T3_38 (io), T16 IO_L4N_T0_39 (io), U15 IO_L24P_T3_38 (io), U16 IO_L4P_T0_39 (io), U17 IO_25_VRP_39 (io)